# Altium footprint library B-NT_CHIPS.PcbLib: 90 footprints (part 5 of 6)
Each footprint in its own frame and in the unit in brackets; x right, y up, seen from the top. Pads: shape width x height; smd on the part's side, far side on the other; paste and mask are expansions set on the pad; w line width, h text height; cw(c..) or ccw(c..) is an arc to the next point about the centre after c.
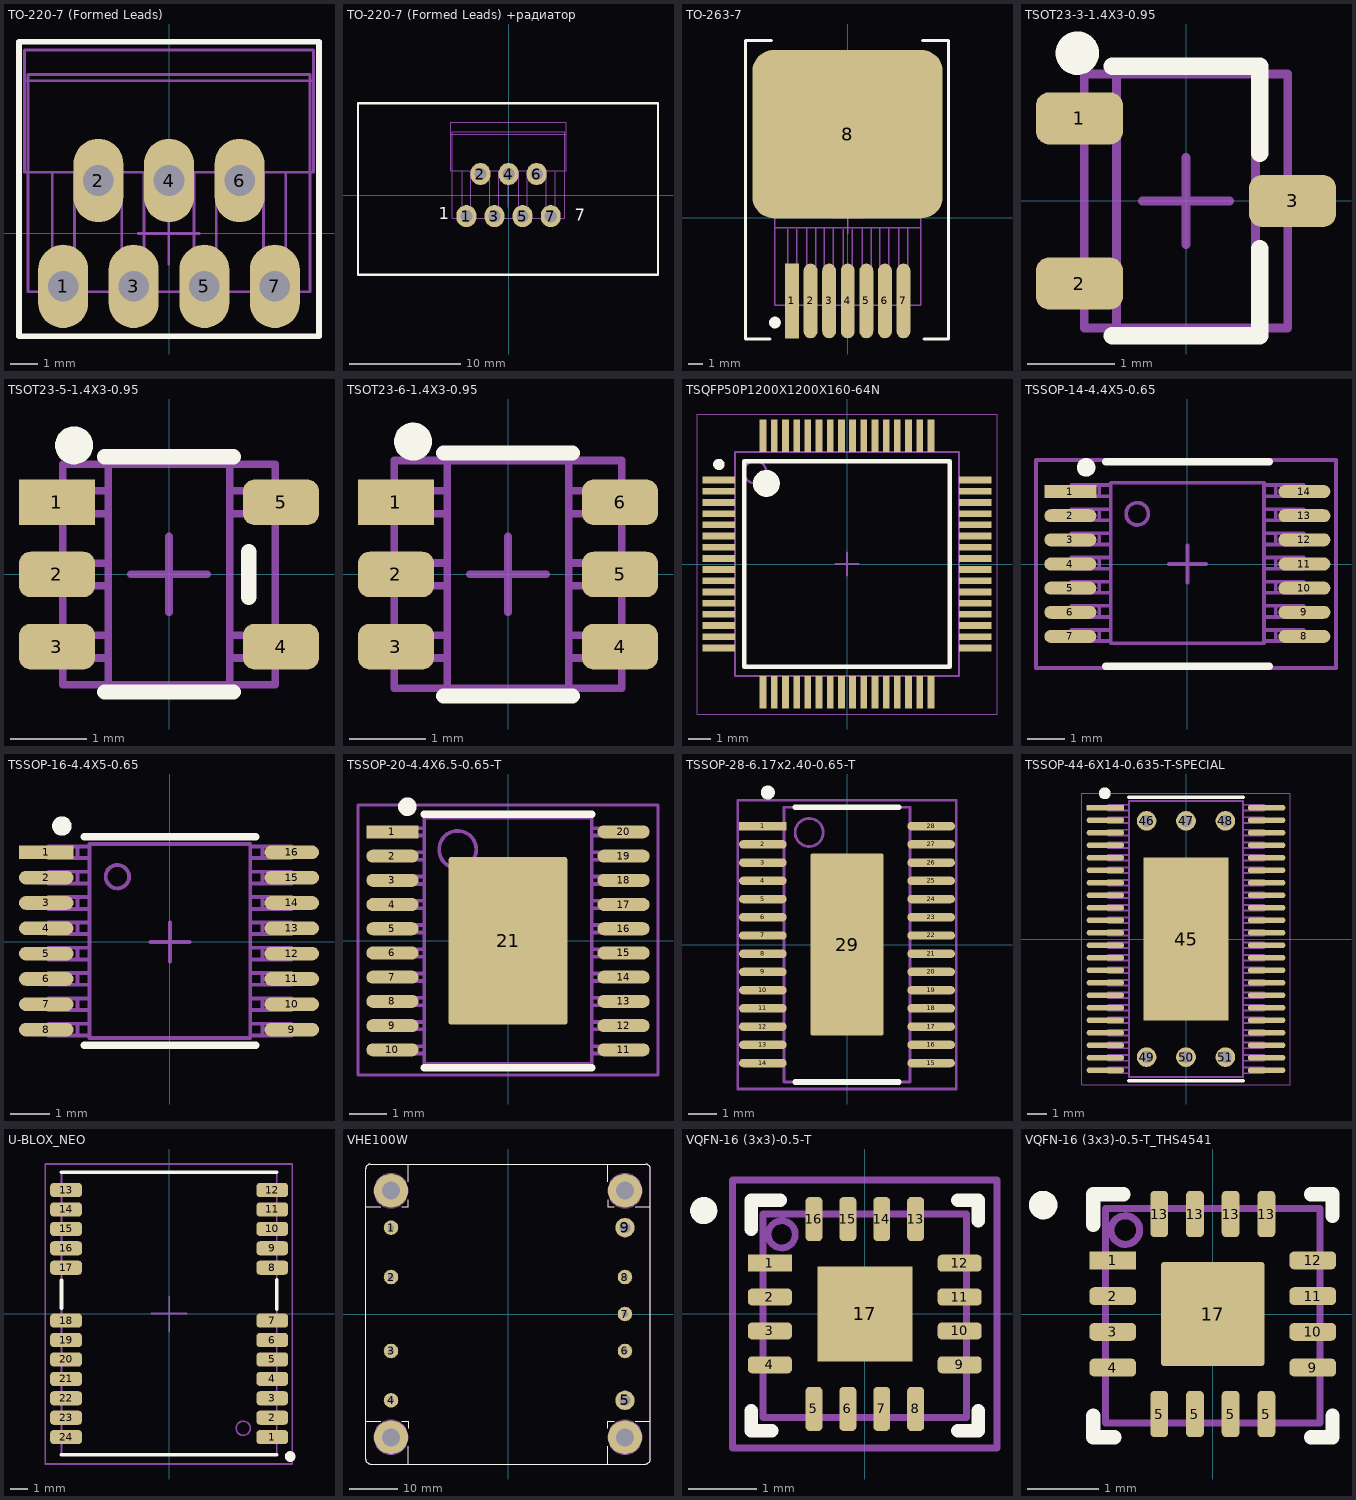
[diagram p4: the footprints below, top view; thin cyan lines are the x and y axes]

## TO-220-7 (Formed Leads) [mm] "TO-220-7"
height 21.4
pads (7):
  oval 1.8x3 hole 1.1: 1(-3.81,-1.905) 2(-2.54,1.905) 3(-1.27,-1.905) 4(0,1.905) 5(1.27,-1.905) 6(2.54,1.905) 7(3.81,-1.905)
Top Overlay:
  lines w0.2: -5.4,-3.7 5.4,-3.7 5.4,6.9 -5.4,6.9 -5.4,-3.7
M3 Top Assy:
  lines w0.1: -5.2,5.5 5.2,5.5 ; -4.2,2.2 -4.2,-2.2 -3.4,-2.2 -3.4,2.2 ; -3,2.2 -3,1.4 -2.1,1.4 -2.1,2.2 ; -1.7,2.2 -1.7,-2.2 -0.9,-2.2 -0.9,2.2 ; -0.4,2.2 -0.4,1.4 0.5,1.4 0.5,2.2 ; 0.9,2.2 0.9,-2.2 1.7,-2.2 1.7,2.2 ; 2.1,2.2 2.1,1.4 3,1.4 3,2.2 ; 3.4,2.2 3.4,-2.2 4.2,-2.2 4.2,2.2 ; -5.2,2.2 -5.2,6.6 5.2,6.6 5.2,2.2 -5.2,2.2
M8 Top Brd Anno:
  lines w0.1: -1.11,-0.005 1.09,-0.005 ; -0.01,-1.105 -0.01,1.095 ; -5.08,-2.1 5.08,-2.1 5.08,5.723 -5.08,5.723 -5.08,-2.1
3D body "SW3DPS-TO-220-7S-DEFAULT.STEP": height 21.08, standoff -5.59, extent -5.08,-2.1 5.08,5.723

## TO-220-7 (Formed Leads) +радиатор [mm] "TO-220-7+ радиатор"
pads (7):
  oval 1.8x2 hole 1.1: 1(-3.81,-1.905) 2(-2.54,1.905) 3(-1.27,-1.905) 4(0,1.905) 5(1.27,-1.905) 6(2.54,1.905) 7(3.81,-1.905)
Top Overlay:
  lines w0.2: -13.6,-7.2 -13.6,8.3 13.5,8.3 13.5,-7.2 -13.6,-7.2
  text "7" at 6,-2.3 h1.1
  text "1" at -6.3,-2.2 h1.1
M3 Top Assy:
  lines w0.1: -5.2,5.5 5.2,5.5 ; -4.2,2.2 -4.2,-2.2 -3.4,-2.2 -3.4,2.2 ; -3,2.2 -3,1.4 -2.2,1.4 ; -2.1,1.4 -2.1,2.2 ; -1.7,2.2 -1.7,-2.2 -0.9,-2.2 -0.9,2.2 ; -0.4,2.2 -0.4,1.4 0.4,1.4 ; 0.5,1.4 0.5,2.2 ; 0.9,2.2 0.9,-2.2 1.7,-2.2 1.7,2.2 ; 2.1,2.2 2.1,1.4 2.9,1.4 ; 3,1.4 3,2.2 ; 3.4,2.2 3.4,-2.2 4.2,-2.2 4.2,2.2 ; -5.2,2.2 5.2,2.2 5.2,6.6 -5.2,6.6 -5.2,2.2
M8 Top Brd Anno:
  lines w0.1: -1.11,-0.005 1.09,-0.005 ; -0.01,-1.105 -0.01,1.095 ; -5.08,-2.1 -5.08,5.723 5.08,5.723 5.08,-2.1 -5.08,-2.1
3D body "SW3DPS-TO-220-7S-HS-DEFAULT.STEP": height 33.78, standoff -5.59, extent -13.335,-7 13.335,8.113

## TO-263-7 [mm] "DDPAK/TO-263-7"
height 4.65
pads (8):
  rect 0.95x5.1 smd: 1(-3.81,-5.7)
  oval 0.95x5.1 smd: 2(-2.54,-5.7) 3(-1.27,-5.7) 4(0,-5.7) 5(1.27,-5.7) 6(2.54,-5.7) 7(3.81,-5.7)
  rrect25% 13x11.5 smd: 8(-0.01,5.7)
Top Overlay:
  circle w0.4: c-4.975,-7.175 r0.2
  lines w0.2: -5.31,-8.3 -7,-8.3 -7,12.1 -5.21,12.1 ; 5.1,12.1 6.9,12.1 6.9,-8.3 5.2,-8.3
M3 Top Assy:
  lines w0.1: -4.1,-0.8 -4.1,-6 -3.5,-6 -3.5,-0.8 ; -2.8,-0.7 -2.8,-6 -2.2,-6 -2.2,-0.7 ; -1.6,-0.7 -1.6,-6 -1,-6 -1,-0.7 ; -0.3,-0.8 -0.3,-6 0.3,-6 0.3,-0.8 ; 1,-0.7 1,-6 1.6,-6 1.6,-0.7 ; 2.2,-0.7 2.2,-6 2.8,-6 2.8,-0.7 ; 3.5,-0.7 3.5,-6 4.1,-6 4.1,-0.7 ; -5,-0.7 5,-0.7 5,9.68 -5,9.68 -5,-0.7
M8 Top Brd Anno:
  lines w0.1: -1.1,0 1.1,0 ; 0,-1.1 0,1.1 ; -5,-5.99 -5,9.68 5,9.68 5,-5.99 -5,-5.99
3D body "SW3dPS-TO263-7-1.STEP": height 4.78, standoff -0.02, extent -5,-5.99 5,9.68

## TSOT23-3-1.4X3-0.95 [mm] "SOT23, 3-Leads, Body 3x1.4 mm, Pitch 0.95mm,"
height 1
pads (3):
  rrect50% 1x0.6 smd: 1(-1.225,0.95) 2(-1.225,-0.95) 3(1.225,0)
Top Overlay:
  circle w0.25: c-1.25,1.7 r0.125
  lines w0.2: -0.85,-1.55 0.85,-1.55 0.85,-0.55 ; -0.85,1.55 0.85,1.55 0.85,0.55
M3 Top Assy:
  lines w0.1: -0.8,-1.1 -1.4,-1.1 -1.4,-0.8 -0.8,-0.8 ; -0.8,0.8 -1.4,0.8 -1.4,1.1 -0.8,1.1 ; -0.8,1.5 -0.8,-1.5 0.8,-1.5 0.8,1.5 ; -0.8,1.525 0.8,1.525 ; 0.8,-0.15 1.4,-0.15 1.4,0.15 0.8,0.15
M8 Top Brd Anno:
  lines w0.1: -0.5,0 0.5,0 ; 0,-0.5 0,0.5 ; -1.17,-1.46 1.17,-1.46 1.17,1.375 1.17,1.46 -1.17,1.46 -1.17,-1.46
3D body "User Library-sot23-1.STEP": height 1, standoff 0, extent -1.17,-1.46 1.17,1.46

## TSOT23-5-1.4X3-0.95 [mm] "SOT-23/SC-74A; 5 Leads; Body 3.1 x 3 mm, inc. leads (LxW max)"
height 1.1
pads (5):
  rect 1x0.6 smd: 1(-1.475,0.95)
  rrect50% 1x0.6 smd: 2(-1.475,0) 3(-1.475,-0.95) 4(1.475,-0.95) 5(1.475,0.95)
Top Overlay:
  circle w0.25: c-1.25,1.7 r0.125
  lines w0.2: -0.85,-1.55 0.85,-1.55 ; -0.85,1.55 0.85,1.55 ; 1.05,-0.3 1.05,0.3
M3 Top Assy:
  lines w0.1: -0.8,-1.1 -1.4,-1.1 -1.4,-0.8 -0.8,-0.8 ; -0.8,-0.15 -1.4,-0.15 -1.4,0.15 -0.8,0.15 ; -0.8,0.8 -1.4,0.8 -1.4,1.1 -0.8,1.1 ; -0.8,1.5 -0.8,-1.5 0.8,-1.5 0.8,1.5 ; -0.8,1.525 0.8,1.525 ; 0.8,-1.1 1.4,-1.1 1.4,-0.8 0.8,-0.8 ; 0.8,0.8 1.4,0.8 1.4,1.1 0.8,1.1
M8 Top Brd Anno:
  lines w0.1: -0.5,0 0.5,0 ; 0,-0.5 0,0.5 ; -1.4,-1.45 -1.4,1.45 1.4,1.45 1.4,-1.45 -1.4,-1.45
3D body "User Library-SOT23-5-2.step": height 1.45, standoff 0, extent -1.4,-1.45 1.4,1.45

## TSOT23-6-1.4X3-0.95 [mm] "SSOT, 6-Leads, Body 2,9x1,75mm, Pitch 0,95mm"
height 1
pads (6):
  rect 1x0.6 smd: 1(-1.475,0.95)
  rrect50% 1x0.6 smd: 2(-1.475,0) 3(-1.475,-0.95) 4(1.475,-0.95) 5(1.475,0) 6(1.475,0.95)
Top Overlay:
  circle w0.25: c-1.25,1.75 r0.125
  lines w0.2: -0.85,-1.6 0.85,-1.6 ; -0.85,1.6 0.85,1.6
M3 Top Assy:
  lines w0.1: -0.8,-1.1 -1.4,-1.1 -1.4,-0.8 -0.8,-0.8 ; -0.8,-0.15 -1.4,-0.15 -1.4,0.15 -0.8,0.15 ; -0.8,0.8 -1.4,0.8 -1.4,1.1 -0.8,1.1 ; 0.8,-1.1 1.4,-1.1 1.4,-0.8 0.8,-0.8 ; 0.8,0.8 1.4,0.8 1.4,1.1 0.8,1.1 ; 0.825,-0.15 1.425,-0.15 1.425,0.15 0.825,0.15 ; -0.8,-1.5 -0.8,1.525 0.8,1.525 0.8,-1.5 -0.8,-1.5
M8 Top Brd Anno:
  lines w0.1: -0.5,0 0.5,0 ; 0,-0.5 0,0.5 ; -1.5,-1.5 1.5,-1.5 1.5,1.5 -1.5,1.5 -1.5,-1.5
3D body "User Library-SSOT-6.STEP": height 1.05, standoff 0, extent -1.5,-1.5 1.5,1.5

## TSQFP50P1200X1200X160-64N [mm] "TSQFP, 64-Leads, Body 10,00x10,00mm, Pitch 0,50mm, IPC Medium Density"
height 1.6
pads (64):
  rect 1.45x0.3 smd: 1(-5.725,3.75) 2(-5.725,3.25) 3(-5.725,2.75) 4(-5.725,2.25) 5(-5.725,1.75) 6(-5.725,1.25) 7(-5.725,0.75) 8(-5.725,0.25) 9(-5.725,-0.25) 10(-5.725,-0.75) 11(-5.725,-1.25) 12(-5.725,-1.75) 13(-5.725,-2.25) 14(-5.725,-2.75) 15(-5.725,-3.25) 16(-5.725,-3.75) 33(5.725,-3.75) 34(5.725,-3.25) 35(5.725,-2.75) 36(5.725,-2.25) 37(5.725,-1.75) 38(5.725,-1.25) 39(5.725,-0.75) 40(5.725,-0.25) 41(5.725,0.25) 42(5.725,0.75) 43(5.725,1.25) 44(5.725,1.75) 45(5.725,2.25) 46(5.725,2.75) 47(5.725,3.25) 48(5.725,3.75)
  rect 0.3x1.45 smd: 17(-3.75,-5.725) 18(-3.25,-5.725) 19(-2.75,-5.725) 20(-2.25,-5.725) 21(-1.75,-5.725) 22(-1.25,-5.725) 23(-0.75,-5.725) 24(-0.25,-5.725) 25(0.25,-5.725) 26(0.75,-5.725) 27(1.25,-5.725) 28(1.75,-5.725) 29(2.25,-5.725) 30(2.75,-5.725) 31(3.25,-5.725) 32(3.75,-5.725) 49(3.75,5.725) 50(3.25,5.725) 51(2.75,5.725) 52(2.25,5.725) 53(1.75,5.725) 54(1.25,5.725) 55(0.75,5.725) 56(0.25,5.725) 57(-0.25,5.725) 58(-0.75,5.725) 59(-1.25,5.725) 60(-1.75,5.725) 61(-2.25,5.725) 62(-2.75,5.725) 63(-3.25,5.725) 64(-3.75,5.725)
Top Overlay:
  circle w0.25: c-5.725,4.45 r0.125
  circle w0.6: c-3.6,3.6 r0.3
  lines w0.2: -4.6,-4.6 -4.6,4.6 4.6,4.6 4.6,-4.6 -4.6,-4.6
Mechanical 13:
  circle w0.1: c-4.1,4.1 r0.5
  lines w0.1: -5,-5 -5,5 5,5 5,-5 -5,-5
Mechanical 15:
  lines w0.05: -6.7,-6.7 -6.7,6.7 6.7,6.7 6.7,-6.7 -6.7,-6.7
  lines w0.1: -0.5,0 0.5,0 ; 0,-0.5 0,0.5
3D body "TSQFP50P1200X1200X160-64N.step": height 1.6, standoff 0, extent -6,-6 6,6

## TSSOP-14-4.4X5-0.65 [mm]
height 1.2
pads (14):
  rect 1.4x0.35 smd: 1(-3.15,1.95)
  oval 1.4x0.35 smd: 2(-3.15,1.3) 3(-3.15,0.65) 4(-3.15,0) 5(-3.15,-0.65) 6(-3.15,-1.3) 7(-3.15,-1.95) 8(3.15,-1.95) 9(3.15,-1.3) 10(3.15,-0.65) 11(3.15,0) 12(3.15,0.65) 13(3.15,1.3) 14(3.15,1.95)
Top Overlay:
  circle w0.25: c-2.725,2.6 r0.125
  lines w0.2: -2.2,-2.75 2.2,-2.75 ; -2.2,2.75 2.2,2.75
M3 Top Assy:
  circle w0.1: c-1.35,1.35 r0.3
  lines w0.1: -2.714,-2.075 -2.714,-1.775 ; -2.714,-1.425 -2.714,-1.125 ; -2.714,-0.775 -2.714,-0.475 ; -2.714,-0.125 -2.714,0.175 ; -2.714,0.525 -2.714,0.825 ; -2.714,1.175 -2.714,1.475 ; -2.714,1.825 -2.714,2.125 ; -2.67,-2.075 -2.67,-1.775 ; -2.67,-1.425 -2.67,-1.125 ; -2.67,-0.775 -2.67,-0.475 ; -2.67,-0.125 -2.67,0.175 ; -2.67,0.525 -2.67,0.825 ; -2.67,1.175 -2.67,1.475 ; -2.67,1.825 -2.67,2.125 ; -2.568,-2.075 -2.568,-1.775 ; -2.568,-1.425 -2.568,-1.125 ; -2.568,-0.775 -2.568,-0.475 ; -2.568,-0.125 -2.568,0.175 ; -2.568,0.525 -2.568,0.825 ; -2.568,1.175 -2.568,1.475 ; -2.568,1.825 -2.568,2.125 ; -2.375,-2.075 -2.375,-1.775 ; -2.375,-1.425 -2.375,-1.125 ; -2.375,-0.775 -2.375,-0.475 ; -2.375,-0.125 -2.375,0.175 ; -2.375,0.525 -2.375,0.825 ; -2.375,1.175 -2.375,1.475 ; -2.375,1.825 -2.375,2.125 ; -2.125,-2.075 -3.125,-2.075 -3.125,-1.775 -2.125,-1.775 ; -2.125,-1.425 -3.125,-1.425 -3.125,-1.125 -2.125,-1.125 ; -2.125,-0.775 -3.125,-0.775 -3.125,-0.475 -2.125,-0.475 ; -2.125,-0.125 -3.125,-0.125 -3.125,0.175 -2.125,0.175 ; -2.125,0.525 -3.125,0.525 -3.125,0.825 -2.125,0.825 ; -2.125,1.175 -3.125,1.175 -3.125,1.475 -2.125,1.475 ; -2.125,1.825 -3.125,1.825 -3.125,2.125 -2.125,2.125 ; 2.125,-2.075 3.125,-2.075 3.125,-1.775 2.125,-1.775 ; 2.125,-1.425 3.125,-1.425 3.125,-1.125 2.125,-1.125 ; 2.125,-0.775 3.125,-0.775 3.125,-0.475 2.125,-0.475 ; 2.125,-0.125 3.125,-0.125 3.125,0.175 2.125,0.175 ; 2.125,0.525 3.125,0.525 3.125,0.825 2.125,0.825 ; 2.125,1.175 3.125,1.175 3.125,1.475 2.125,1.475 ; 2.125,1.825 3.125,1.825 3.125,2.125 2.125,2.125 ; 2.375,-2.075 2.375,-1.775 ; 2.375,-1.425 2.375,-1.125 ; 2.375,-0.775 2.375,-0.475 ; 2.375,-0.125 2.375,0.175 ; 2.375,0.525 2.375,0.825 ; 2.375,1.175 2.375,1.475 ; 2.375,1.825 2.375,2.125 ; 2.568,-2.075 2.568,-1.775 ; 2.568,-1.425 2.568,-1.125 ; 2.568,-0.775 2.568,-0.475 ; 2.568,-0.125 2.568,0.175 ; 2.568,0.525 2.568,0.825 ; 2.568,1.175 2.568,1.475 ; 2.568,1.825 2.568,2.125 ; 2.67,-2.075 2.67,-1.775 ; 2.67,-1.425 2.67,-1.125 ; 2.67,-0.775 2.67,-0.475 ; 2.67,-0.125 2.67,0.175 ; 2.67,0.525 2.67,0.825 ; 2.67,1.175 2.67,1.475 ; 2.67,1.825 2.67,2.125 ; 2.714,-2.075 2.714,-1.775 ; 2.714,-1.425 2.714,-1.125 ; 2.714,-0.775 2.714,-0.475 ; 2.714,-0.125 2.714,0.175 ; 2.714,0.525 2.714,0.825 ; 2.714,1.175 2.714,1.475 ; 2.714,1.825 2.714,2.125 ; -2.062,-2.137 -2.062,2.187 2.062,2.187 2.062,-2.137 -2.062,-2.137
M8 Top Brd Anno:
  lines w0.1: -0.5,0 0.5,0 ; 0,-0.5 0,0.5 ; -4.075,-2.8 4,-2.8 4,2.8 -4.075,2.8 -4.075,-2.8
3D body "TSSOP-14-4.4X5-0.65.step": height 1.2, standoff 0, extent -3.2,-2.55 3.2,2.55

## TSSOP-16-4.4X5-0.65 [mm] "QSOP, 16 Leads, Body 5.1x4.5mm (max), Pitch 0.65mm"
height 1.2
pads (16):
  rect 1.4x0.35 smd: 1(-3.175,2.3)
  oval 1.4x0.35 smd: 2(-3.175,1.65) 3(-3.175,1) 4(-3.175,0.35) 5(-3.175,-0.3) 6(-3.175,-0.95) 7(-3.175,-1.6) 8(-3.175,-2.25) 9(3.125,-2.25) 10(3.125,-1.6) 11(3.125,-0.95) 12(3.125,-0.3) 13(3.125,0.35) 14(3.125,1) 15(3.125,1.65) 16(3.125,2.3)
Top Overlay:
  circle w0.25: c-2.775,2.975 r0.125
  lines w0.2: -2.2,-2.65 2.2,-2.65 ; -2.2,2.7 2.2,2.7
M3 Top Assy:
  circle w0.1: c-1.35,1.675 r0.3
  lines w0.1: -2.714,-2.4 -2.714,-2.1 ; -2.714,-1.75 -2.714,-1.45 ; -2.714,-1.1 -2.714,-0.8 ; -2.714,-0.45 -2.714,-0.15 ; -2.714,0.2 -2.714,0.5 ; -2.714,0.85 -2.714,1.15 ; -2.714,1.5 -2.714,1.8 ; -2.714,2.15 -2.714,2.45 ; -2.67,-2.4 -2.67,-2.1 ; -2.67,-1.75 -2.67,-1.45 ; -2.67,-1.1 -2.67,-0.8 ; -2.67,-0.45 -2.67,-0.15 ; -2.67,0.2 -2.67,0.5 ; -2.67,0.85 -2.67,1.15 ; -2.67,1.5 -2.67,1.8 ; -2.67,2.15 -2.67,2.45 ; -2.568,-2.4 -2.568,-2.1 ; -2.568,-1.75 -2.568,-1.45 ; -2.568,-1.1 -2.568,-0.8 ; -2.568,-0.45 -2.568,-0.15 ; -2.568,0.2 -2.568,0.5 ; -2.568,0.85 -2.568,1.15 ; -2.568,1.5 -2.568,1.8 ; -2.568,2.15 -2.568,2.45 ; -2.375,-2.4 -2.375,-2.1 ; -2.375,-1.75 -2.375,-1.45 ; -2.375,-1.1 -2.375,-0.8 ; -2.375,-0.45 -2.375,-0.15 ; -2.375,0.2 -2.375,0.5 ; -2.375,0.85 -2.375,1.15 ; -2.375,1.5 -2.375,1.8 ; -2.375,2.15 -2.375,2.45 ; -2.125,-2.4 -3.125,-2.4 -3.125,-2.1 -2.125,-2.1 ; -2.125,-1.75 -3.125,-1.75 -3.125,-1.45 -2.125,-1.45 ; -2.125,-1.1 -3.125,-1.1 -3.125,-0.8 -2.125,-0.8 ; -2.125,-0.45 -3.125,-0.45 -3.125,-0.15 -2.125,-0.15 ; -2.125,0.2 -3.125,0.2 -3.125,0.5 -2.125,0.5 ; -2.125,0.85 -3.125,0.85 -3.125,1.15 -2.125,1.15 ; -2.125,1.5 -3.125,1.5 -3.125,1.8 -2.125,1.8 ; -2.125,2.15 -3.125,2.15 -3.125,2.45 -2.125,2.45 ; 2.125,-2.4 3.125,-2.4 3.125,-2.1 2.125,-2.1 ; 2.125,-1.75 3.125,-1.75 3.125,-1.45 2.125,-1.45 ; 2.125,-1.1 3.125,-1.1 3.125,-0.8 2.125,-0.8 ; 2.125,-0.45 3.125,-0.45 3.125,-0.15 2.125,-0.15 ; 2.125,0.2 3.125,0.2 3.125,0.5 2.125,0.5 ; 2.125,0.85 3.125,0.85 3.125,1.15 2.125,1.15 ; 2.125,1.5 3.125,1.5 3.125,1.8 2.125,1.8 ; 2.125,2.15 3.125,2.15 3.125,2.45 2.125,2.45 ; 2.375,-2.4 2.375,-2.1 ; 2.375,-1.75 2.375,-1.45 ; 2.375,-1.1 2.375,-0.8 ; 2.375,-0.45 2.375,-0.15 ; 2.375,0.2 2.375,0.5 ; 2.375,0.85 2.375,1.15 ; 2.375,1.5 2.375,1.8 ; 2.375,2.15 2.375,2.45 ; 2.568,-2.4 2.568,-2.1 ; 2.568,-1.75 2.568,-1.45 ; 2.568,-1.1 2.568,-0.8 ; 2.568,-0.45 2.568,-0.15 ; 2.568,0.2 2.568,0.5 ; 2.568,0.85 2.568,1.15 ; 2.568,1.5 2.568,1.8 ; 2.568,2.15 2.568,2.45 ; 2.67,-2.4 2.67,-2.1 ; 2.67,-1.75 2.67,-1.45 ; 2.67,-1.1 2.67,-0.8 ; 2.67,-0.45 2.67,-0.15 ; 2.67,0.2 2.67,0.5 ; 2.67,0.85 2.67,1.15 ; 2.67,1.5 2.67,1.8 ; 2.67,2.15 2.67,2.45 ; 2.714,-2.4 2.714,-2.1 ; 2.714,-1.75 2.714,-1.45 ; 2.714,-1.1 2.714,-0.8 ; 2.714,-0.45 2.714,-0.15 ; 2.714,0.2 2.714,0.5 ; 2.714,0.85 2.714,1.15 ; 2.714,1.5 2.714,1.8 ; 2.714,2.15 2.714,2.45 ; -2.062,-2.462 2.062,-2.462 2.062,2.512 -2.062,2.512 -2.062,-2.462
M8 Top Brd Anno:
  lines w0.1: -0.5,0 0.5,0 ; 0,-0.5 0,0.5
3D body "TSOP65P640X125-16N.step": height 1.25, standoff 0, extent -3.225,-2.525 3.175,2.575

## TSSOP-20-4.4X6.5-0.65-T [mm] "TSOP, 20-Leads, Body 6.5x4.4mm, Pitch 0.65mm, IPC Medium Density"
height 1.1
pads (21):
  rect 1.4x0.35 smd: 1(-3.1,2.925)
  oval 1.4x0.35 smd: 2(-3.1,2.275) 3(-3.1,1.625) 4(-3.1,0.975) 5(-3.1,0.325) 6(-3.1,-0.325) 7(-3.1,-0.975) 8(-3.1,-1.625) 9(-3.1,-2.275) 10(-3.1,-2.925) 11(3.1,-2.925) 12(3.1,-2.275) 13(3.1,-1.625) 14(3.1,-0.975) 15(3.1,-0.325) 16(3.1,0.325) 17(3.1,0.975) 18(3.1,1.625) 19(3.1,2.275) 20(3.1,2.925)
  rrect5% 3.2x4.5 smd: 21(0,0)
Top Overlay:
  circle w0.25: c-2.7,3.6 r0.125
  lines w0.2: -2.25,-3.4 2.25,-3.4 ; -2.25,3.4 2.25,3.4
M3 Top Assy:
  circle w0.1: c-1.35,2.45 r0.5
  lines w0.1: -2.25,-3.025 -3.2,-3.025 -3.2,-2.825 -2.25,-2.825 ; -2.25,-2.375 -3.2,-2.375 -3.2,-2.175 -2.25,-2.175 ; -2.25,-1.725 -3.2,-1.725 -3.2,-1.525 -2.25,-1.525 ; -2.25,-1.075 -3.2,-1.075 -3.2,-0.875 -2.25,-0.875 ; -2.25,-0.425 -3.2,-0.425 -3.2,-0.225 -2.25,-0.225 ; -2.25,0.225 -3.2,0.225 -3.2,0.425 -2.25,0.425 ; -2.25,0.875 -3.2,0.875 -3.2,1.075 -2.25,1.075 ; -2.25,1.525 -3.2,1.525 -3.2,1.725 -2.25,1.725 ; -2.25,2.175 -3.2,2.175 -3.2,2.375 -2.25,2.375 ; -2.25,2.825 -3.2,2.825 -3.2,3.025 -2.25,3.025 ; 2.25,-3.025 3.2,-3.025 3.2,-2.825 2.25,-2.825 ; 2.25,-2.375 3.2,-2.375 3.2,-2.175 2.25,-2.175 ; 2.25,-1.725 3.2,-1.725 3.2,-1.525 2.25,-1.525 ; 2.25,-1.075 3.2,-1.075 3.2,-0.875 2.25,-0.875 ; 2.25,-0.425 3.2,-0.425 3.2,-0.225 2.25,-0.225 ; 2.25,0.225 3.2,0.225 3.2,0.425 2.25,0.425 ; 2.25,0.875 3.2,0.875 3.2,1.075 2.25,1.075 ; 2.25,1.525 3.2,1.525 3.2,1.725 2.25,1.725 ; 2.25,2.175 3.2,2.175 3.2,2.375 2.25,2.375 ; 2.25,2.825 3.2,2.825 3.2,3.025 2.25,3.025 ; -2.25,-3.3 2.25,-3.3 2.25,3.3 -2.25,3.3 -2.25,-3.3
M8 Top Brd Anno:
  lines w0.076: -4.025,-3.6 4.025,-3.6 4.025,3.65 -4.025,3.65 -4.025,-3.6
  lines w0.1: -0.5,0 0.5,0 ; 0,-0.5 0,0.5
3D body "User Library-TSSOP-20-2.STEP": height 1.2, standoff 0, extent -3.2,-3.25 3.2,3.25

## TSSOP-28-6.17x2.40-0.65-T [mm] "TSOP, 28-Leads, Body 9,70x4,40mm, Pitch 0,65mm, Thermal Pad 6,17x2,40mm, IPC Medium Density"
height 1.2
pads (29):
  rect 1.7x0.3 smd: 1(-3,4.225)
  oval 1.7x0.3 smd: 2(-3,3.575) 3(-3,2.925) 4(-3,2.275) 5(-3,1.625) 6(-3,0.975) 7(-3,0.325) 8(-3,-0.325) 9(-3,-0.975) 10(-3,-1.625) 11(-3,-2.275) 12(-3,-2.925) 13(-3,-3.575) 14(-3,-4.225) 15(3,-4.225) 16(3,-3.575) 17(3,-2.925) 18(3,-2.275) 19(3,-1.625) 20(3,-0.975) 21(3,-0.325) 22(3,0.325) 23(3,0.975) 24(3,1.625) 25(3,2.275) 26(3,2.925) 27(3,3.575) 28(3,4.225)
  rrect5% 2.6x6.5 smd: 29(0,0)
Top Overlay:
  circle w0.25: c-2.825,5.425 r0.125
  lines w0.2: -1.85,-4.9 1.85,-4.9 ; -1.85,4.9 1.85,4.9
M3 Top Assy:
  circle w0.1: c-1.35,4 r0.5
  lines w0.1: -2.25,-4.9 -2.25,4.9 2.25,4.9 2.25,-4.9 -2.25,-4.9
M8 Top Brd Anno:
  lines w0.1: -0.5,0 0.5,0 ; 0,-0.5 0,0.5 ; -3.9,-5.15 -3.9,5.15 3.9,5.15 3.9,-5.15 -3.9,-5.15
3D body "TSSOP-28-.step": height 1.2, standoff 0, extent -3.2,-4.9 3.2,4.9

## TSSOP-44-6X14-0.635-T-SPECIAL [mm]
height 1.2
pads (51):
  rect 1.9x0.3 smd: 1(-4.1,6.667)
  oval 1.9x0.3 smd: 2(-4.1,6.032) 3(-4.1,5.397) 4(-4.1,4.763) 5(-4.1,4.127) 6(-4.1,3.492) 7(-4.1,2.857) 8(-4.1,2.222) 9(-4.1,1.587) 10(-4.1,0.953) 11(-4.1,0.318) 12(-4.1,-0.318) 13(-4.1,-0.953) 14(-4.1,-1.587) 15(-4.1,-2.222) 16(-4.1,-2.857) 17(-4.1,-3.492) 18(-4.1,-4.127) 19(-4.1,-4.763) 20(-4.1,-5.397) 21(-4.1,-6.032) 22(-4.1,-6.667) 23(4.1,-6.667) 24(4.1,-6.032) 25(4.1,-5.397) 26(4.1,-4.763) 27(4.1,-4.127) 28(4.1,-3.492) 29(4.1,-2.857) 30(4.1,-2.222) 31(4.1,-1.587) 32(4.1,-0.953) 33(4.1,-0.318) 34(4.1,0.318) 35(4.1,0.953) 36(4.1,1.587) 37(4.1,2.222) 38(4.1,2.857) 39(4.1,3.492) 40(4.1,4.127) 41(4.1,4.763) 42(4.1,5.397) 43(4.1,6.032) 44(4.1,6.667)
  rect 4.3x8.3 smd: 45(0,0)
  round 1 hole 0.6: 46(-2,6) 47(0,6) 48(2,6) 49(-2,-6) 50(0,-6) 51(2,-6)
Top Overlay:
  circle w0.3: c-4.125,7.4 r0.15
  lines w0.2: -2.9,-7.2 2.9,-7.2 ; -2.9,7.2 2.9,7.2
M3 Top Assy:
  drawing of 326 lines, arcs and shapes, not listed
M8 Top Brd Anno:
  lines w0.05: -5.3,-7.4 -5.3,7.4 5.3,7.4 5.3,-7.4 -5.3,-7.4
3D body "44-TSSOP.STEP": height 1.35, standoff 0, extent -4.15,-7.05 4.15,7.05

## U-BLOX_NEO [mm]
height 3
pads (24):
  rrect50% 1.8x0.8 smd: 1(5.842,-7) 2(5.842,-5.9) 3(5.842,-4.8) 4(5.842,-3.7) 5(5.842,-2.6) 6(5.842,-1.5) 7(5.842,-0.4) 8(5.842,2.6) 9(5.842,3.7) 10(5.842,4.8) 11(5.842,5.9) 12(5.842,7) 13(-5.842,7) 14(-5.842,5.9) 15(-5.842,4.8) 16(-5.842,3.7) 17(-5.842,2.6) 18(-5.842,-0.4) 19(-5.842,-1.5) 20(-5.842,-2.6) 21(-5.842,-3.7) 22(-5.842,-4.8) 23(-5.842,-5.9) 24(-5.842,-7)
Top Overlay:
  circle w0.3: c6.85,-8.1 r0.15
  lines w0.2: -6.109,-8 6.096,-8 ; -6.109,7.996 6.09,7.996 ; -6.102,0.299 -6.102,1.893 ; 6.096,0.255 6.096,1.919
M3 Top Assy:
  circle w0.1: c4.2,-6.5 r0.4
  lines w0.1: -6.1,-8 -6.1,8 6.1,8 6.1,-8 -6.1,-8
M8 Top Brd Anno:
  lines w0.1: -1.02,0 0,0 ; 0,-1.024 0,0 ; 0,0.976 0,0 ; 0.98,0 0,0 ; -7.02,-8.524 6.98,-8.524 6.98,8.476 -7.02,8.476 -7.02,-8.524
3D body "NEO (STEP-AP214)_B.STEP": height 2.28, standoff -0.05, extent -6.104,-8 6.096,8

## VHE100W [mm] "(61.0mm x 57.9mm x 12.7mm)"
height 10.2
pads (13):
  round 3 hole 1.2: 1(-24.1,17.78) 2(-24.1,7.62) 3(-24.1,-7.62) 4(-24.1,-17.78) 6(24.1,-7.62) 7(24.1,0) 8(24.1,7.62)
  round 4 hole 2.2: 5(24.1,-17.78) 9(24.1,17.78)
  round 7 hole 3.7: ""(-24.1,-25.4) ""(-24.1,25.4) ""(24.1,-25.4) ""(24.1,25.4)
Top Overlay:
  lines w0.2: -29.35,29.875 cw(c-28.35,29.875) -28.35,30.875 28.35,30.875 cw(c28.35,29.875) 29.35,29.875 ; -29.35,29.9 -29.35,-29.875 ccw(c-28.35,-29.875) -28.35,-30.875 ; -29.325,-22.05 -26.2,-22.05 ; -29.325,22.05 -26.2,22.05 ; -28.35,-30.9 28.4,-30.9 ; -21.9,-22.125 -20.5,-22.125 -20.5,-23.525 ; -21.9,22.125 -20.5,22.125 -20.5,23.525 ; -20.5,-30.875 -20.5,-27.2 ; -20.5,27.2 -20.5,30.875 ; 20.5,-30.875 20.5,-27.2 ; 20.5,-23.525 20.5,-22.125 21.9,-22.125 ; 20.5,23.525 20.5,22.125 21.9,22.125 ; 20.5,27.2 20.5,30.875 ; 26.2,-22.05 29.325,-22.05 ; 26.2,22.05 29.325,22.05 ; 28.35,-30.875 ccw(c28.35,-29.875) 29.35,-29.875 29.35,29.9
M3 Top Assy:
  circle w0.1: c-24.1,25.4 r3.523
  circle w0.1: c24.1,25.4 r3.523
  circle w0.1: c-24.1,-25.4 r3.523
  circle w0.1: c24.1,-25.4 r3.523
  lines w0.1: -29.35,29.875 cw(c-28.35,29.875) -28.35,30.875 ; -29.35,29.9 -29.35,-29.875 ccw(c-28.35,-29.875) -28.35,-30.875 ; -28.35,-30.9 28.4,-30.9 ; -28.35,30.9 28.35,30.9 ; 28.35,-30.875 ccw(c28.35,-29.875) 29.35,-29.875 29.35,29.9 ; 28.35,30.875 cw(c28.35,29.875) 29.35,29.875
3D body "WHB100.STEP": height 12.5, standoff -4.5, extent -28.95,-30.5 28.95,30.5

## VQFN-16 (3x3)-0.5-T [mm] "Body 3.1x3.1x1mm(max)"
height 1
pads (17):
  rect 0.65x0.25 smd: 1(-1.4,0.75)
  rrect50% 0.65x0.25 smd: 2(-1.4,0.25) 3(-1.4,-0.25) 4(-1.4,-0.75) 9(1.4,-0.75) 10(1.4,-0.25) 11(1.4,0.25) 12(1.4,0.75)
  rrect50% 0.25x0.65 smd: 5(-0.75,-1.4) 6(-0.25,-1.4) 7(0.25,-1.4) 8(0.75,-1.4) 13(0.75,1.4) 14(0.25,1.4) 15(-0.25,1.4) 16(-0.75,1.4)
  rect 1.4x1.4 smd: 17(0,0)
Top Overlay:
  circle w0.2: c-2.375,1.525 r0.1
  lines w0.2: -1.675,-1.425 -1.675,-1.725 -1.375,-1.725 ; -1.675,1.25 -1.675,1.675 -1.25,1.675 ; 1.375,-1.725 1.675,-1.725 1.675,-1.425 ; 1.375,1.675 1.675,1.675 1.675,1.375
M3 Top Assy:
  circle w0.1: c-1.225,1.175 r0.2
  lines w0.1: -1.5,-1.525 1.5,-1.525 1.5,1.475 -1.5,1.475 -1.5,-1.525
M8 Top Brd Anno:
  lines w0.1: -0.4,0 0.4,0 ; 0,-0.4 0,0.4 ; -1.95,-1.975 1.95,-1.975 1.95,1.975 -1.95,1.975 -1.95,-1.975
3D body "RGT0016A.stp": height 1, standoff 0, extent -1.5,-1.5 1.5,1.5
3D body: height 0.25, standoff 0, extent 2.475,1.1 2.475,1.1
3D body "RGT0016A.stp": height 1, standoff 0, extent -1.5,-1.5 1.5,1.5

## VQFN-16 (3x3)-0.5-T_THS4541 [mm] "Body 3.1x3.1x1mm(max)"
height 1
pads (17):
  rect 0.65x0.25 smd: 1(-1.4,0.75)
  rrect50% 0.65x0.25 smd: 2(-1.4,0.25) 3(-1.4,-0.25) 4(-1.4,-0.75) 9(1.4,-0.75) 10(1.4,-0.25) 11(1.4,0.25) 12(1.4,0.75)
  rrect50% 0.25x0.65 smd: 5(-0.75,-1.4) 5(-0.25,-1.4) 5(0.25,-1.4) 5(0.75,-1.4) 13(-0.75,1.4) 13(-0.25,1.4) 13(0.25,1.4) 13(0.75,1.4)
  rrect5% 1.45x1.45 smd: 17(0,0)
Top Overlay:
  circle w0.2: c-2.375,1.525 r0.1
  lines w0.2: -1.675,-1.425 -1.675,-1.725 -1.375,-1.725 ; -1.675,1.25 -1.675,1.675 -1.25,1.675 ; 1.375,-1.725 1.675,-1.725 1.675,-1.425 ; 1.375,1.675 1.675,1.675 1.675,1.375
M3 Top Assy:
  circle w0.1: c-1.225,1.175 r0.2
  lines w0.1: -1.5,-1.525 -1.5,1.475 1.5,1.475 1.5,-1.525 -1.5,-1.525
M8 Top Brd Anno:
  lines w0.1: -0.4,0 0.4,0 ; 0,-0.4 0,0.4
3D body "RGT0016A.stp": height 1, standoff 0, extent -1.5,-1.5 1.5,1.5
3D body: height 0.25, standoff 0, extent 2.475,1.1 2.475,1.1
3D body "RGT0016A.stp": height 1, standoff 0, extent -1.5,-1.5 1.5,1.5